# Altium schematic symbol library LATTICEPLDS_Library.SchLib: 291 symbols (part 2 of 32)
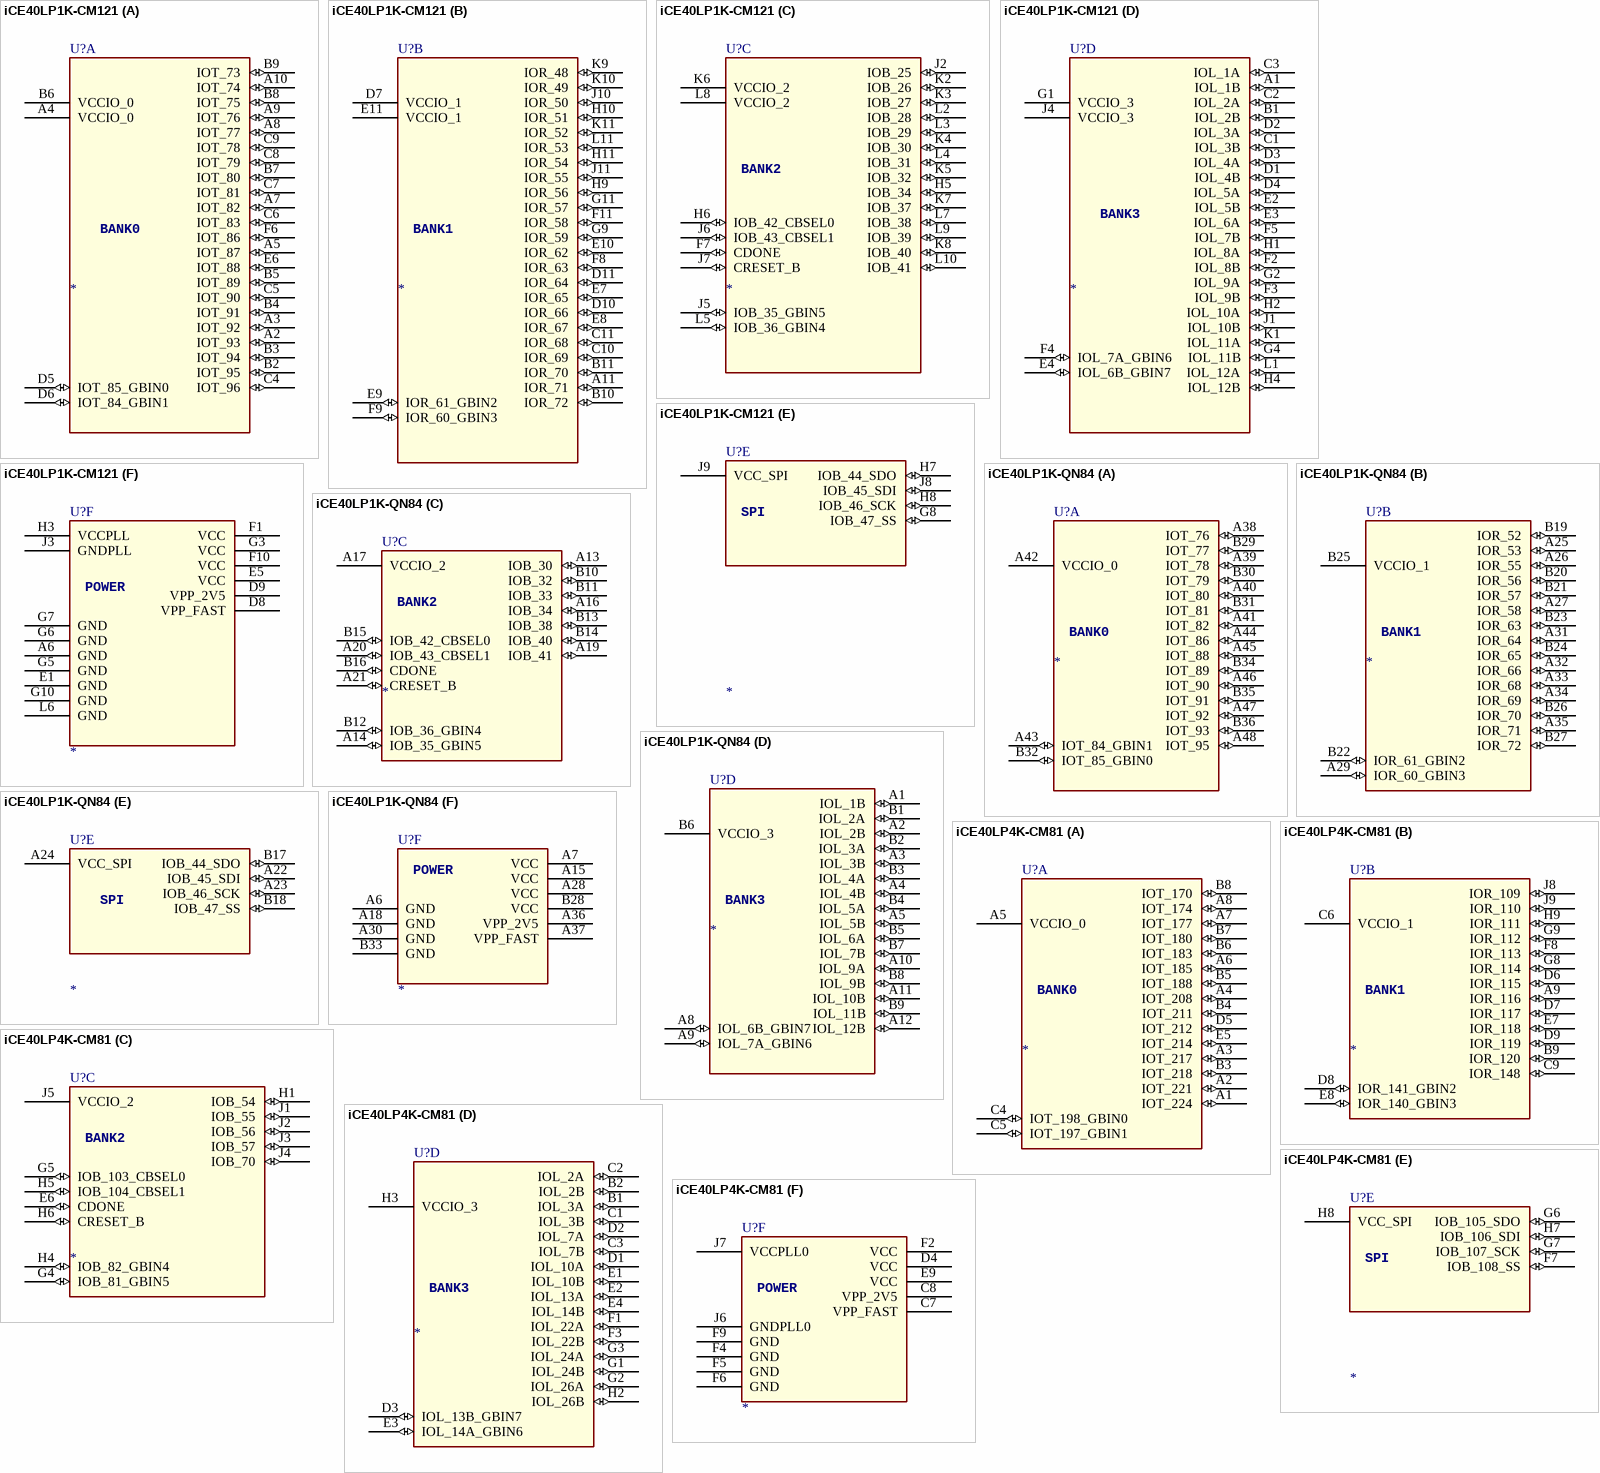
[diagram p304: symbols iCE40LP1K-CM121 to iCE40LP4K-CM81]

## iCE40LP1K-CM121
designator U?
SPLIT_INST: TRUE; SWAP_INFO: (S1+S2+S3+S4+S5+S6)
part A pins: A2 IOT_93 (io), A3 IOT_92 (io), A4 VCCIO_0 (power), A5 IOT_87 (io), A7 IOT_82 (io), A8 IOT_77 (io), A9 IOT_76 (io), A10 IOT_74 (io), B2 IOT_95 (io), B3 IOT_94 (io), B4 IOT_91 (io), B5 IOT_89 (io), B6 VCCIO_0 (power), B7 IOT_80 (io), B8 IOT_75 (io), B9 IOT_73 (io), C4 IOT_96 (io), C5 IOT_90 (io), C6 IOT_83 (io), C7 IOT_81 (io), C8 IOT_79 (io), C9 IOT_78 (io), D5 IOT_85_GBIN0 (io), D6 IOT_84_GBIN1 (io), E6 IOT_88 (io), F6 IOT_86 (io)
part B pins: A11 IOR_71 (io), B10 IOR_72 (io), B11 IOR_70 (io), C10 IOR_69 (io), C11 IOR_68 (io), D7 VCCIO_1 (power), D10 IOR_66 (io), D11 IOR_64 (io), E7 IOR_65 (io), E8 IOR_67 (io), E9 IOR_61_GBIN2 (io), E10 IOR_62 (io), E11 VCCIO_1 (power), F8 IOR_63 (io), F9 IOR_60_GBIN3 (io), F11 IOR_58 (io), G9 IOR_59 (io), G11 IOR_57 (io), H9 IOR_56 (io), H10 IOR_51 (io), H11 IOR_54 (io), J10 IOR_50 (io), J11 IOR_55 (io), K9 IOR_48 (io), K10 IOR_49 (io), K11 IOR_52 (io), L11 IOR_53 (io)
part C pins: F7 CDONE (io), H5 IOB_34 (io), H6 IOB_42_CBSEL0 (io), J2 IOB_25 (io), J5 IOB_35_GBIN5 (io), J6 IOB_43_CBSEL1 (io), J7 CRESET_B (io), K2 IOB_26 (io), K3 IOB_27 (io), K4 IOB_30 (io), K5 IOB_32 (io), K6 VCCIO_2 (power), K7 IOB_37 (io), K8 IOB_40 (io), L2 IOB_28 (io), L3 IOB_29 (io), L4 IOB_31 (io), L5 IOB_36_GBIN4 (io), L7 IOB_38 (io), L8 VCCIO_2 (power), L9 IOB_39 (io), L10 IOB_41 (io)
part D pins: A1 IOL_1B (io), B1 IOL_2B (io), C1 IOL_3B (io), C2 IOL_2A (io), C3 IOL_1A (io), D1 IOL_4B (io), D2 IOL_3A (io), D3 IOL_4A (io), D4 IOL_5A (io), E2 IOL_5B (io), E3 IOL_6A (io), E4 IOL_6B_GBIN7 (io), F2 IOL_8B (io), F3 IOL_9B (io), F4 IOL_7A_GBIN6 (io), F5 IOL_7B (io), G1 VCCIO_3 (power), G2 IOL_9A (io), G4 IOL_11B (io), H1 IOL_8A (io), H2 IOL_10A (io), H4 IOL_12B (io), J1 IOL_10B (io), J4 VCCIO_3 (power), K1 IOL_11A (io), L1 IOL_12A (io)
part E pins: G8 IOB_47_SS (io), H7 IOB_44_SDO (io), H8 IOB_46_SCK (io), J8 IOB_45_SDI (io), J9 VCC_SPI (power)
part F pins: A6 GND (power), D8 VPP_FAST (power), D9 VPP_2V5 (power), E1 GND (power), E5 VCC (power), F1 VCC (power), F10 VCC (power), G3 VCC (power), G5 GND (power), G6 GND (power), G7 GND (power), G10 GND (power), H3 VCCPLL (power), J3 GNDPLL (power), L6 GND (power)
part A text: BANK0
part B text: BANK1
part C text: BANK2
part D text: BANK3
part E text: SPI
part F text: POWER

## iCE40LP1K-QN84
designator U?
SPLIT_INST: TRUE; SWAP_INFO: (S1+S2+S3+S4+S5+S6)
part A pins: A38 IOT_76 (io), A39 IOT_78 (io), A40 IOT_80 (io), A41 IOT_82 (io), A42 VCCIO_0 (power), A43 IOT_84_GBIN1 (io), A44 IOT_86 (io), A45 IOT_88 (io), A46 IOT_90 (io), A47 IOT_92 (io), A48 IOT_95 (io), B29 IOT_77 (io), B30 IOT_79 (io), B31 IOT_81 (io), B32 IOT_85_GBIN0 (io), B34 IOT_89 (io), B35 IOT_91 (io), B36 IOT_93 (io)
part B pins: A25 IOR_53 (io), A26 IOR_55 (io), A27 IOR_58 (io), A29 IOR_60_GBIN3 (io), A31 IOR_64 (io), A32 IOR_66 (io), A33 IOR_68 (io), A34 IOR_69 (io), A35 IOR_71 (io), B19 IOR_52 (io), B20 IOR_56 (io), B21 IOR_57 (io), B22 IOR_61_GBIN2 (io), B23 IOR_63 (io), B24 IOR_65 (io), B25 VCCIO_1 (power), B26 IOR_70 (io), B27 IOR_72 (io)
part C pins: A13 IOB_30 (io), A14 IOB_35_GBIN5 (io), A16 IOB_34 (io), A17 VCCIO_2 (power), A19 IOB_41 (io), A20 IOB_43_CBSEL1 (io), A21 CRESET_B (io), B10 IOB_32 (io), B11 IOB_33 (io), B12 IOB_36_GBIN4 (io), B13 IOB_38 (io), B14 IOB_40 (io), B15 IOB_42_CBSEL0 (io), B16 CDONE (io)
part D pins: A1 IOL_1B (io), A2 IOL_2B (io), A3 IOL_3B (io), A4 IOL_4B (io), A5 IOL_5B (io), A8 IOL_6B_GBIN7 (io), A9 IOL_7A_GBIN6 (io), A10 IOL_9A (io), A11 IOL_10B (io), A12 IOL_12B (io), B1 IOL_2A (io), B2 IOL_3A (io), B3 IOL_4A (io), B4 IOL_5A (io), B5 IOL_6A (io), B6 VCCIO_3 (power), B7 IOL_7B (io), B8 IOL_9B (io), B9 IOL_11B (io)
part E pins: A22 IOB_45_SDI (io), A23 IOB_46_SCK (io), A24 VCC_SPI (power), B17 IOB_44_SDO (io), B18 IOB_47_SS (io)
part F pins: A6 GND (power), A7 VCC (power), A15 VCC (power), A18 GND (power), A28 VCC (power), A30 GND (power), A36 VPP_2V5 (power), A37 VPP_FAST (power), B28 VCC (power), B33 GND (power)
part A text: BANK0
part B text: BANK1
part C text: BANK2
part D text: BANK3
part E text: SPI
part F text: POWER

## iCE40LP4K-CM81
designator U?
SWAP_INFO: (S1+S2+S3+S4+S5+S6); SPLIT_INST: TRUE
part A pins: A1 IOT_224 (io), A2 IOT_221 (io), A3 IOT_217 (io), A4 IOT_208 (io), A5 VCCIO_0 (power), A6 IOT_185 (io), A7 IOT_177 (io), A8 IOT_174 (io), B3 IOT_218 (io), B4 IOT_211 (io), B5 IOT_188 (io), B6 IOT_183 (io), B7 IOT_180 (io), B8 IOT_170 (io), C4 IOT_198_GBIN0 (io), C5 IOT_197_GBIN1 (io), D5 IOT_212 (io), E5 IOT_214 (io)
part B pins: A9 IOR_116 (io), B9 IOR_120 (io), C6 VCCIO_1 (power), C9 IOR_148 (io), D6 IOR_115 (io), D7 IOR_117 (io), D8 IOR_141_GBIN2 (io), D9 IOR_119 (io), E7 IOR_118 (io), E8 IOR_140_GBIN3 (io), F8 IOR_113 (io), G8 IOR_114 (io), G9 IOR_112 (io), H9 IOR_111 (io), J8 IOR_109 (io), J9 IOR_110 (io)
part C pins: E6 CDONE (io), G4 IOB_81_GBIN5 (io), G5 IOB_103_CBSEL0 (io), H1 IOB_54 (io), H4 IOB_82_GBIN4 (io), H5 IOB_104_CBSEL1 (io), H6 CRESET_B (io), J1 IOB_55 (io), J2 IOB_56 (io), J3 IOB_57 (io), J4 IOB_70 (io), J5 VCCIO_2 (power)
part D pins: B1 IOL_3A (io), B2 IOL_2B (io), C1 IOL_3B (io), C2 IOL_2A (io), C3 IOL_7B (io), D1 IOL_10A (io), D2 IOL_7A (io), D3 IOL_13B_GBIN7 (io), E1 IOL_10B (io), E2 IOL_13A (io), E3 IOL_14A_GBIN6 (io), E4 IOL_14B (io), F1 IOL_22A (io), F3 IOL_22B (io), G1 IOL_24B (io), G2 IOL_26A (io), G3 IOL_24A (io), H2 IOL_26B (io), H3 VCCIO_3 (power)
part E pins: F7 IOB_108_SS (io), G6 IOB_105_SDO (io), G7 IOB_107_SCK (io), H7 IOB_106_SDI (io), H8 VCC_SPI (power)
part F pins: C7 VPP_FAST (power), C8 VPP_2V5 (power), D4 VCC (power), E9 VCC (power), F2 VCC (power), F4 GND (power), F5 GND (power), F6 GND (power), F9 GND (power), J6 GNDPLL0 (power), J7 VCCPLL0 (power)
part A text: BANK0
part B text: BANK1
part C text: BANK2
part D text: BANK3
part E text: SPI
part F text: POWER

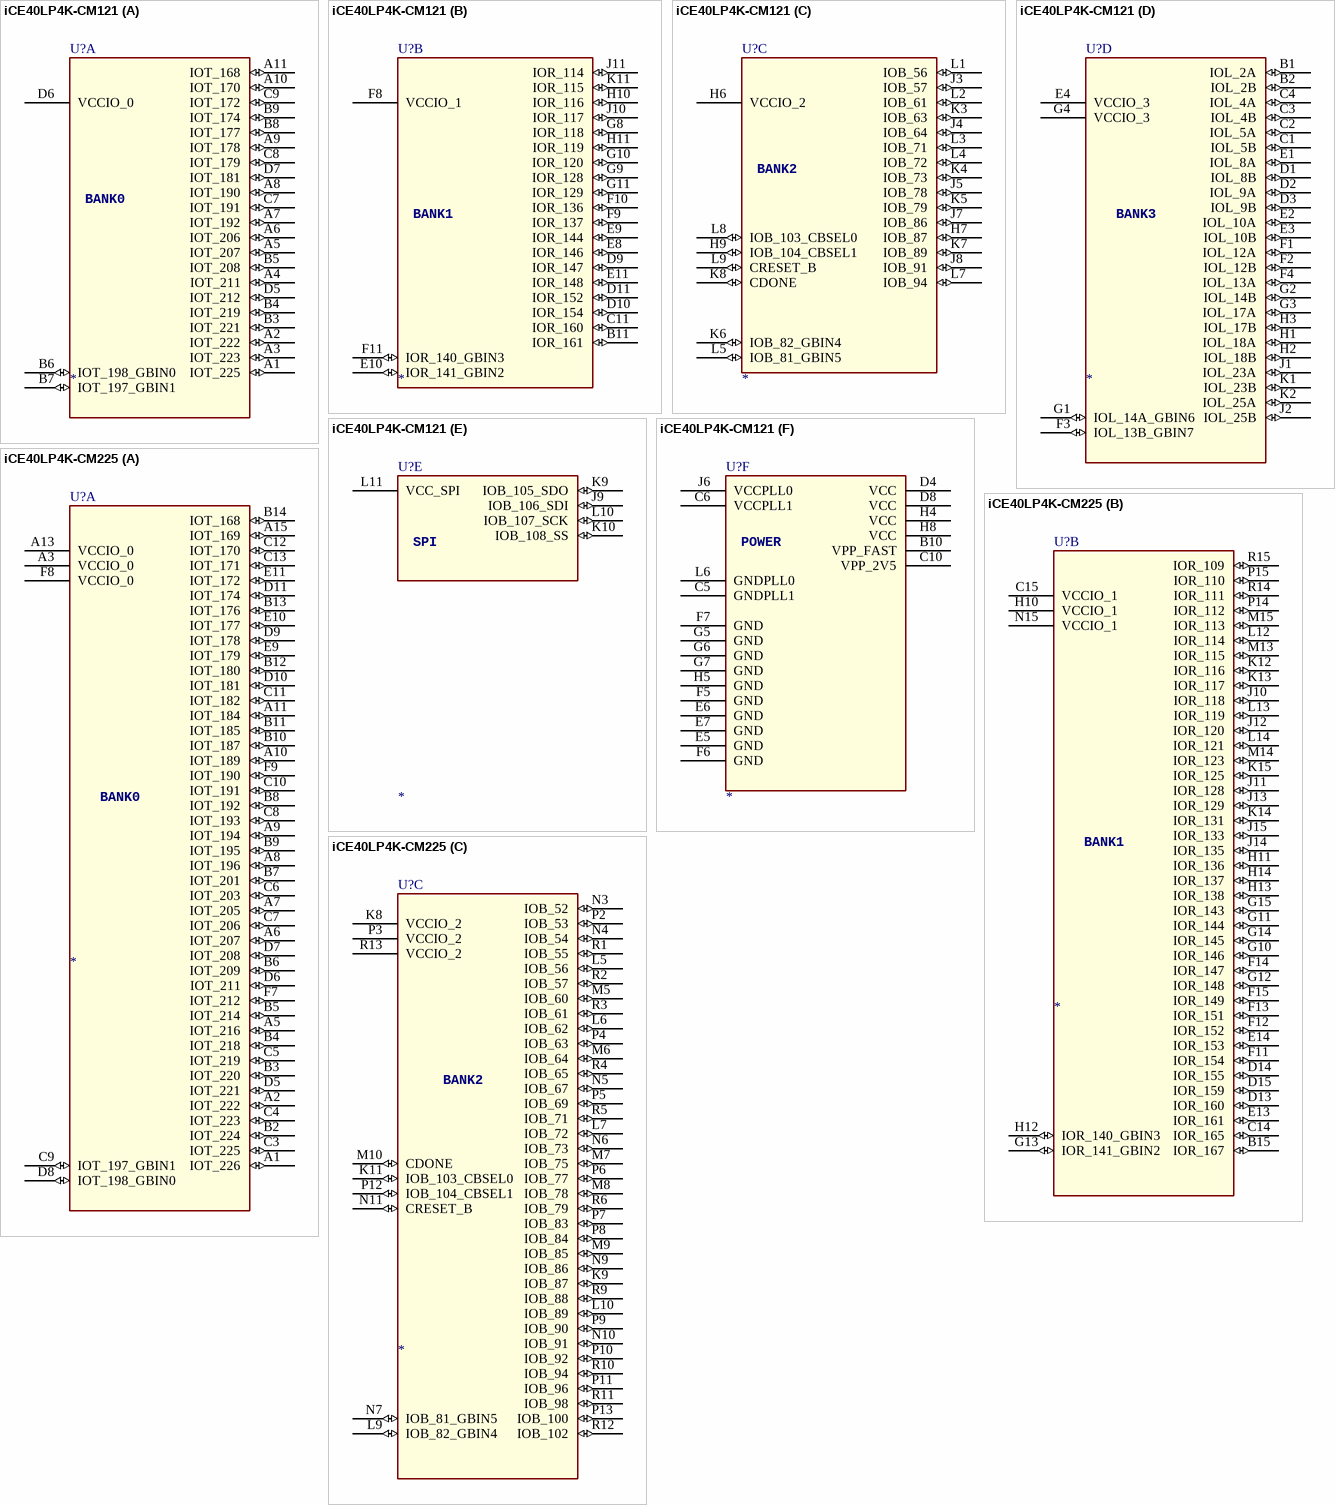
[diagram p11: symbols iCE40LP4K-CM121 to iCE40LP4K-CM225]

## iCE40LP4K-CM121
designator U?
SPLIT_INST: TRUE; SWAP_INFO: (S1+S2+S3+S4+S5+S6)
part A pins: A1 IOT_225 (io), A2 IOT_222 (io), A3 IOT_223 (io), A4 IOT_211 (io), A5 IOT_207 (io), A6 IOT_206 (io), A7 IOT_192 (io), A8 IOT_190 (io), A9 IOT_178 (io), A10 IOT_170 (io), A11 IOT_168 (io), B3 IOT_221 (io), B4 IOT_219 (io), B5 IOT_208 (io), B6 IOT_198_GBIN0 (io), B7 IOT_197_GBIN1 (io), B8 IOT_177 (io), B9 IOT_174 (io), C7 IOT_191 (io), C8 IOT_179 (io), C9 IOT_172 (io), D5 IOT_212 (io), D6 VCCIO_0 (power), D7 IOT_181 (io)
part B pins: B11 IOR_161 (io), C11 IOR_160 (io), D9 IOR_147 (io), D10 IOR_154 (io), D11 IOR_152 (io), E8 IOR_146 (io), E9 IOR_144 (io), E10 IOR_141_GBIN2 (io), E11 IOR_148 (io), F8 VCCIO_1 (power), F9 IOR_137 (io), F10 IOR_136 (io), F11 IOR_140_GBIN3 (io), G8 IOR_118 (io), G9 IOR_128 (io), G10 IOR_120 (io), G11 IOR_129 (io), H10 IOR_116 (io), H11 IOR_119 (io), J10 IOR_117 (io), J11 IOR_114 (io), K11 IOR_115 (io)
part C pins: H6 VCCIO_2 (power), H7 IOB_87 (io), H9 IOB_104_CBSEL1 (io), J3 IOB_57 (io), J4 IOB_64 (io), J5 IOB_78 (io), J7 IOB_86 (io), J8 IOB_91 (io), K3 IOB_63 (io), K4 IOB_73 (io), K5 IOB_79 (io), K6 IOB_82_GBIN4 (io), K7 IOB_89 (io), K8 CDONE (io), L1 IOB_56 (io), L2 IOB_61 (io), L3 IOB_71 (io), L4 IOB_72 (io), L5 IOB_81_GBIN5 (io), L7 IOB_94 (io), L8 IOB_103_CBSEL0 (io), L9 CRESET_B (io)
part D pins: B1 IOL_2A (io), B2 IOL_2B (io), C1 IOL_5B (io), C2 IOL_5A (io), C3 IOL_4B (io), C4 IOL_4A (io), D1 IOL_8B (io), D2 IOL_9A (io), D3 IOL_9B (io), E1 IOL_8A (io), E2 IOL_10A (io), E3 IOL_10B (io), E4 VCCIO_3 (power), F1 IOL_12A (io), F2 IOL_12B (io), F3 IOL_13B_GBIN7 (io), F4 IOL_13A (io), G1 IOL_14A_GBIN6 (io), G2 IOL_14B (io), G3 IOL_17A (io), G4 VCCIO_3 (power), H1 IOL_18A (io), H2 IOL_18B (io), H3 IOL_17B (io), J1 IOL_23A (io), J2 IOL_25B (io), K1 IOL_23B (io), K2 IOL_25A (io)
part E pins: J9 IOB_106_SDI (io), K9 IOB_105_SDO (io), K10 IOB_108_SS (io), L10 IOB_107_SCK (io), L11 VCC_SPI (power)
part F pins: B10 VPP_FAST (power), C5 GNDPLL1 (power), C6 VCCPLL1 (power), C10 VPP_2V5 (power), D4 VCC (power), D8 VCC (power), E5 GND (power), E6 GND (power), E7 GND (power), F5 GND (power), F6 GND (power), F7 GND (power), G5 GND (power), G6 GND (power), G7 GND (power), H4 VCC (power), H5 GND (power), H8 VCC (power), J6 VCCPLL0 (power), L6 GNDPLL0 (power)
part A text: BANK0
part B text: BANK1
part C text: BANK2
part D text: BANK3
part E text: SPI
part F text: POWER

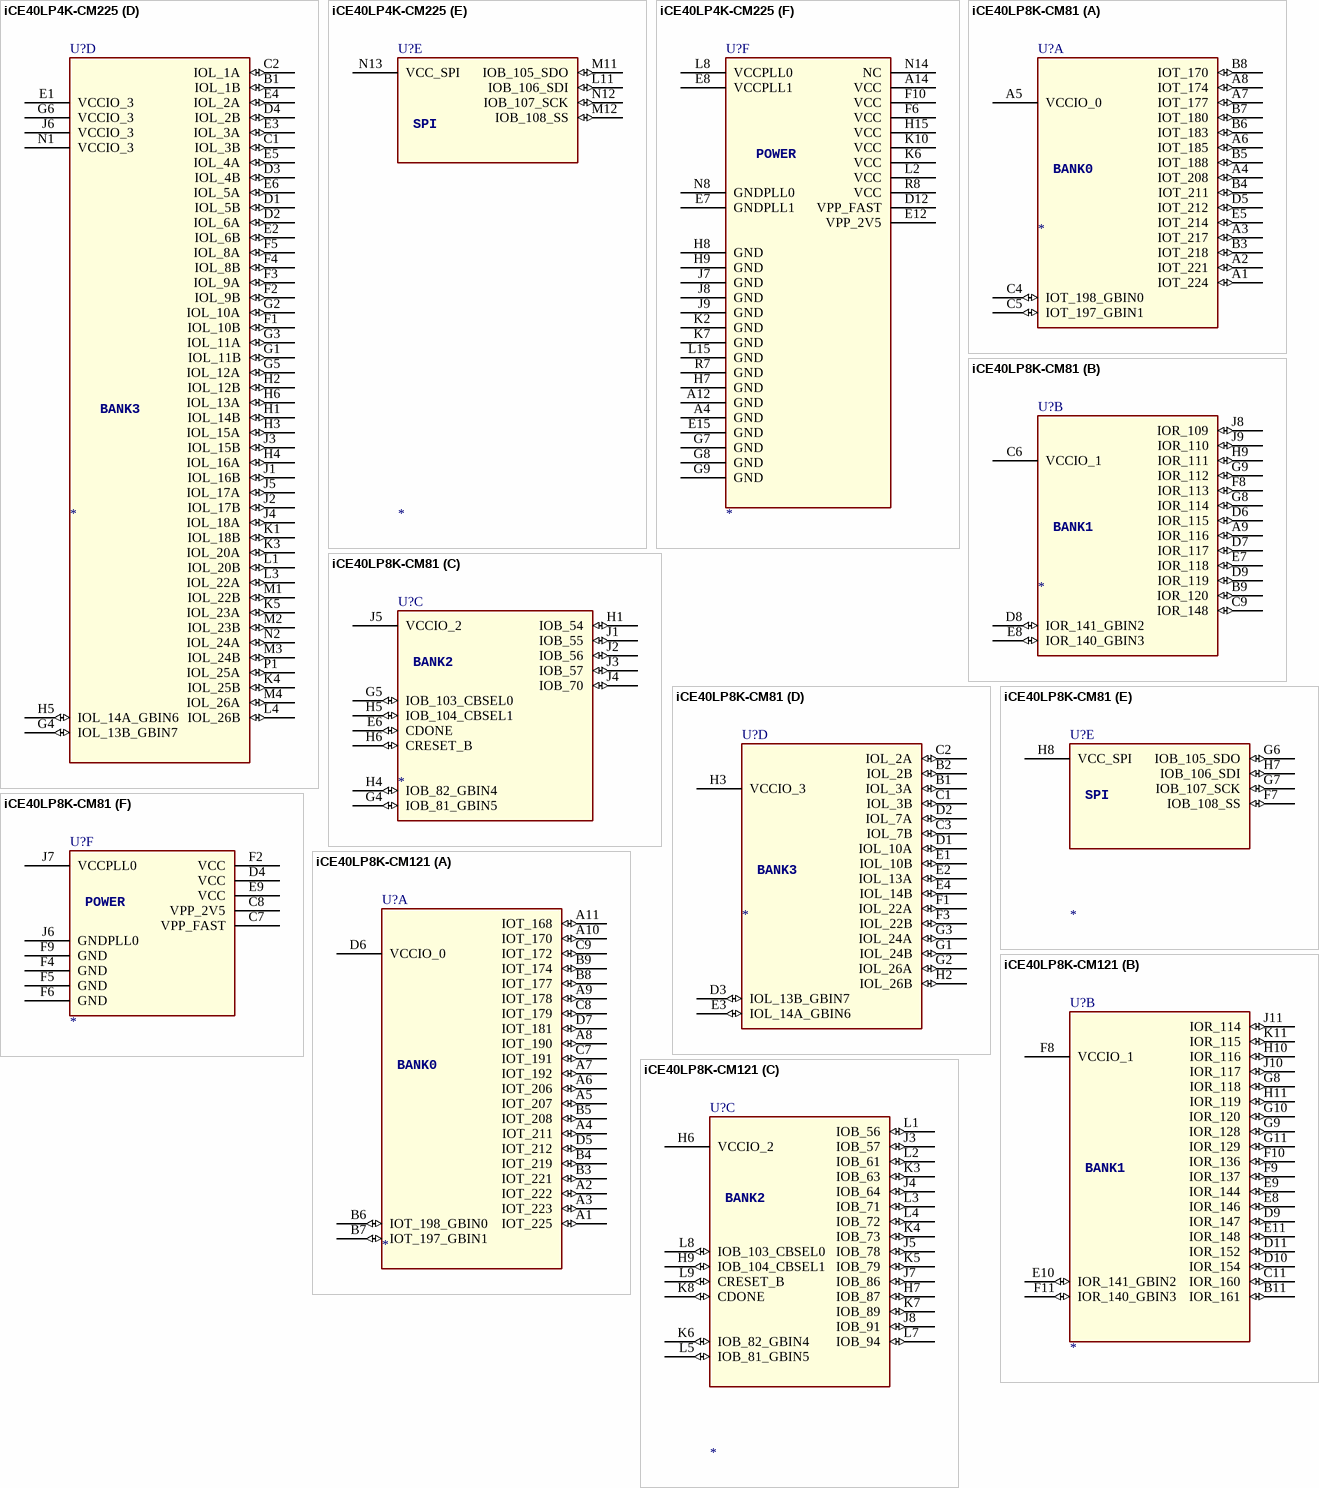
[diagram p12: symbols iCE40LP4K-CM225 to iCE40LP8K-CM121]

## iCE40LP4K-CM225
designator U?
SPLIT_INST: TRUE; SWAP_INFO: (S1+S2+S3+S4+S5+S6)
part A pins: A1 IOT_226 (io), A2 IOT_222 (io), A3 VCCIO_0 (power), A5 IOT_216 (io), A6 IOT_207 (io), A7 IOT_205 (io), A8 IOT_196 (io), A9 IOT_194 (io), A10 IOT_189 (io), A11 IOT_184 (io), A13 VCCIO_0 (power), A15 IOT_169 (io), B2 IOT_224 (io), B3 IOT_220 (io), B4 IOT_218 (io), B5 IOT_214 (io), B6 IOT_209 (io), B7 IOT_201 (io), B8 IOT_192 (io), B9 IOT_195 (io), B10 IOT_187 (io), B11 IOT_185 (io), B12 IOT_180 (io), B13 IOT_176 (io), B14 IOT_168 (io), C3 IOT_225 (io), C4 IOT_223 (io), C5 IOT_219 (io), C6 IOT_203 (io), C7 IOT_206 (io), C8 IOT_193 (io), C9 IOT_197_GBIN1 (io), C10 IOT_191 (io), C11 IOT_182 (io), C12 IOT_170 (io), C13 IOT_171 (io), D5 IOT_221 (io), D6 IOT_211 (io), D7 IOT_208 (io), D8 IOT_198_GBIN0 (io), D9 IOT_178 (io), D10 IOT_181 (io), D11 IOT_174 (io), E9 IOT_179 (io), E10 IOT_177 (io), E11 IOT_172 (io), F7 IOT_212 (io), F8 VCCIO_0 (power), F9 IOT_190 (io)
part B pins: B15 IOR_167 (io), C14 IOR_165 (io), C15 VCCIO_1 (power), D13 IOR_160 (io), D14 IOR_155 (io), D15 IOR_159 (io), E13 IOR_161 (io), E14 IOR_153 (io), F11 IOR_154 (io), F12 IOR_152 (io), F13 IOR_151 (io), F14 IOR_147 (io), F15 IOR_149 (io), G10 IOR_146 (io), G11 IOR_144 (io), G12 IOR_148 (io), G13 IOR_141_GBIN2 (io), G14 IOR_145 (io), G15 IOR_143 (io), H10 VCCIO_1 (power), H11 IOR_136 (io), H12 IOR_140_GBIN3 (io), H13 IOR_138 (io), H14 IOR_137 (io), J10 IOR_118 (io), J11 IOR_128 (io), J12 IOR_120 (io), J13 IOR_129 (io), J14 IOR_135 (io), J15 IOR_133 (io), K12 IOR_116 (io), K13 IOR_117 (io), K14 IOR_131 (io), K15 IOR_125 (io), L12 IOR_114 (io), L13 IOR_119 (io), L14 IOR_121 (io), M13 IOR_115 (io), M14 IOR_123 (io), M15 IOR_113 (io), N15 VCCIO_1 (power), P14 IOR_112 (io), P15 IOR_110 (io), R14 IOR_111 (io), R15 IOR_109 (io)
part C pins: K8 VCCIO_2 (power), K9 IOB_87 (io), K11 IOB_103_CBSEL0 (io), L5 IOB_56 (io), L6 IOB_62 (io), L7 IOB_72 (io), L9 IOB_82_GBIN4 (io), L10 IOB_89 (io), M5 IOB_60 (io), M6 IOB_64 (io), M7 IOB_75 (io), M8 IOB_78 (io), M9 IOB_85 (io), M10 CDONE (io), N3 IOB_52 (io), N4 IOB_54 (io), N5 IOB_67 (io), N6 IOB_73 (io), N7 IOB_81_GBIN5 (io), N9 IOB_86 (io), N10 IOB_91 (io), N11 CRESET_B (io), P2 IOB_53 (io), P3 VCCIO_2 (power), P4 IOB_63 (io), P5 IOB_69 (io), P6 IOB_77 (io), P7 IOB_83 (io), P8 IOB_84 (io), P9 IOB_90 (io), P10 IOB_92 (io), P11 IOB_96 (io), P12 IOB_104_CBSEL1 (io), P13 IOB_100 (io), R1 IOB_55 (io), R2 IOB_57 (io), R3 IOB_61 (io), R4 IOB_65 (io), R5 IOB_71 (io), R6 IOB_79 (io), R9 IOB_88 (io), R10 IOB_94 (io), R11 IOB_98 (io), R12 IOB_102 (io), R13 VCCIO_2 (power)
part D pins: B1 IOL_1B (io), C1 IOL_3B (io), C2 IOL_1A (io), D1 IOL_5B (io), D2 IOL_6A (io), D3 IOL_4B (io), D4 IOL_2B (io), E1 VCCIO_3 (power), E2 IOL_6B (io), E3 IOL_3A (io), E4 IOL_2A (io), E5 IOL_4A (io), E6 IOL_5A (io), F1 IOL_10B (io), F2 IOL_9B (io), F3 IOL_9A (io), F4 IOL_8B (io), F5 IOL_8A (io), G1 IOL_11B (io), G2 IOL_10A (io), G3 IOL_11A (io), G4 IOL_13B_GBIN7 (io), G5 IOL_12A (io), G6 VCCIO_3 (power), H1 IOL_14B (io), H2 IOL_12B (io), H3 IOL_15A (io), H4 IOL_16A (io), H5 IOL_14A_GBIN6 (io), H6 IOL_13A (io), J1 IOL_16B (io), J2 IOL_17B (io), J3 IOL_15B (io), J4 IOL_18A (io), J5 IOL_17A (io), J6 VCCIO_3 (power), K1 IOL_18B (io), K3 IOL_20A (io), K4 IOL_25B (io), K5 IOL_23A (io), L1 IOL_20B (io), L3 IOL_22A (io), L4 IOL_26B (io), M1 IOL_22B (io), M2 IOL_23B (io), M3 IOL_24B (io), M4 IOL_26A (io), N1 VCCIO_3 (power), N2 IOL_24A (io), P1 IOL_25A (io)
part E pins: L11 IOB_106_SDI (io), M11 IOB_105_SDO (io), M12 IOB_108_SS (io), N12 IOB_107_SCK (io), N13 VCC_SPI (power)
part F pins: A4 GND (power), A12 GND (power), A14 VCC (power), D12 VPP_FAST (power), E7 GNDPLL1 (power), E8 VCCPLL1 (power), E12 VPP_2V5 (power), E15 GND (power), F6 VCC (power), F10 VCC (power), G7 GND (power), G8 GND (power), G9 GND (power), H7 GND (power), H8 GND (power), H9 GND (power), H15 VCC (power), J7 GND (power), J8 GND (power), J9 GND (power), K2 GND (power), K6 VCC (power), K7 GND (power), K10 VCC (power), L2 VCC (power), L8 VCCPLL0 (power), L15 GND (power), N8 GNDPLL0 (power), N14 NC (power), R7 GND (power), R8 VCC (power)
part A text: BANK0
part B text: BANK1
part C text: BANK2
part D text: BANK3
part E text: SPI
part F text: POWER

## iCE40LP8K-CM81
designator U?
SPLIT_INST: TRUE; SWAP_INFO: (S1+S2+S3+S4+S5+S6)
part A pins: A1 IOT_224 (io), A2 IOT_221 (io), A3 IOT_217 (io), A4 IOT_208 (io), A5 VCCIO_0 (power), A6 IOT_185 (io), A7 IOT_177 (io), A8 IOT_174 (io), B3 IOT_218 (io), B4 IOT_211 (io), B5 IOT_188 (io), B6 IOT_183 (io), B7 IOT_180 (io), B8 IOT_170 (io), C4 IOT_198_GBIN0 (io), C5 IOT_197_GBIN1 (io), D5 IOT_212 (io), E5 IOT_214 (io)
part B pins: A9 IOR_116 (io), B9 IOR_120 (io), C6 VCCIO_1 (power), C9 IOR_148 (io), D6 IOR_115 (io), D7 IOR_117 (io), D8 IOR_141_GBIN2 (io), D9 IOR_119 (io), E7 IOR_118 (io), E8 IOR_140_GBIN3 (io), F8 IOR_113 (io), G8 IOR_114 (io), G9 IOR_112 (io), H9 IOR_111 (io), J8 IOR_109 (io), J9 IOR_110 (io)
part C pins: E6 CDONE (io), G4 IOB_81_GBIN5 (io), G5 IOB_103_CBSEL0 (io), H1 IOB_54 (io), H4 IOB_82_GBIN4 (io), H5 IOB_104_CBSEL1 (io), H6 CRESET_B (io), J1 IOB_55 (io), J2 IOB_56 (io), J3 IOB_57 (io), J4 IOB_70 (io), J5 VCCIO_2 (power)
part D pins: B1 IOL_3A (io), B2 IOL_2B (io), C1 IOL_3B (io), C2 IOL_2A (io), C3 IOL_7B (io), D1 IOL_10A (io), D2 IOL_7A (io), D3 IOL_13B_GBIN7 (io), E1 IOL_10B (io), E2 IOL_13A (io), E3 IOL_14A_GBIN6 (io), E4 IOL_14B (io), F1 IOL_22A (io), F3 IOL_22B (io), G1 IOL_24B (io), G2 IOL_26A (io), G3 IOL_24A (io), H2 IOL_26B (io), H3 VCCIO_3 (power)
part E pins: F7 IOB_108_SS (io), G6 IOB_105_SDO (io), G7 IOB_107_SCK (io), H7 IOB_106_SDI (io), H8 VCC_SPI (power)
part F pins: C7 VPP_FAST (power), C8 VPP_2V5 (power), D4 VCC (power), E9 VCC (power), F2 VCC (power), F4 GND (power), F5 GND (power), F6 GND (power), F9 GND (power), J6 GNDPLL0 (power), J7 VCCPLL0 (power)
part A text: BANK0
part B text: BANK1
part C text: BANK2
part D text: BANK3
part E text: SPI
part F text: POWER

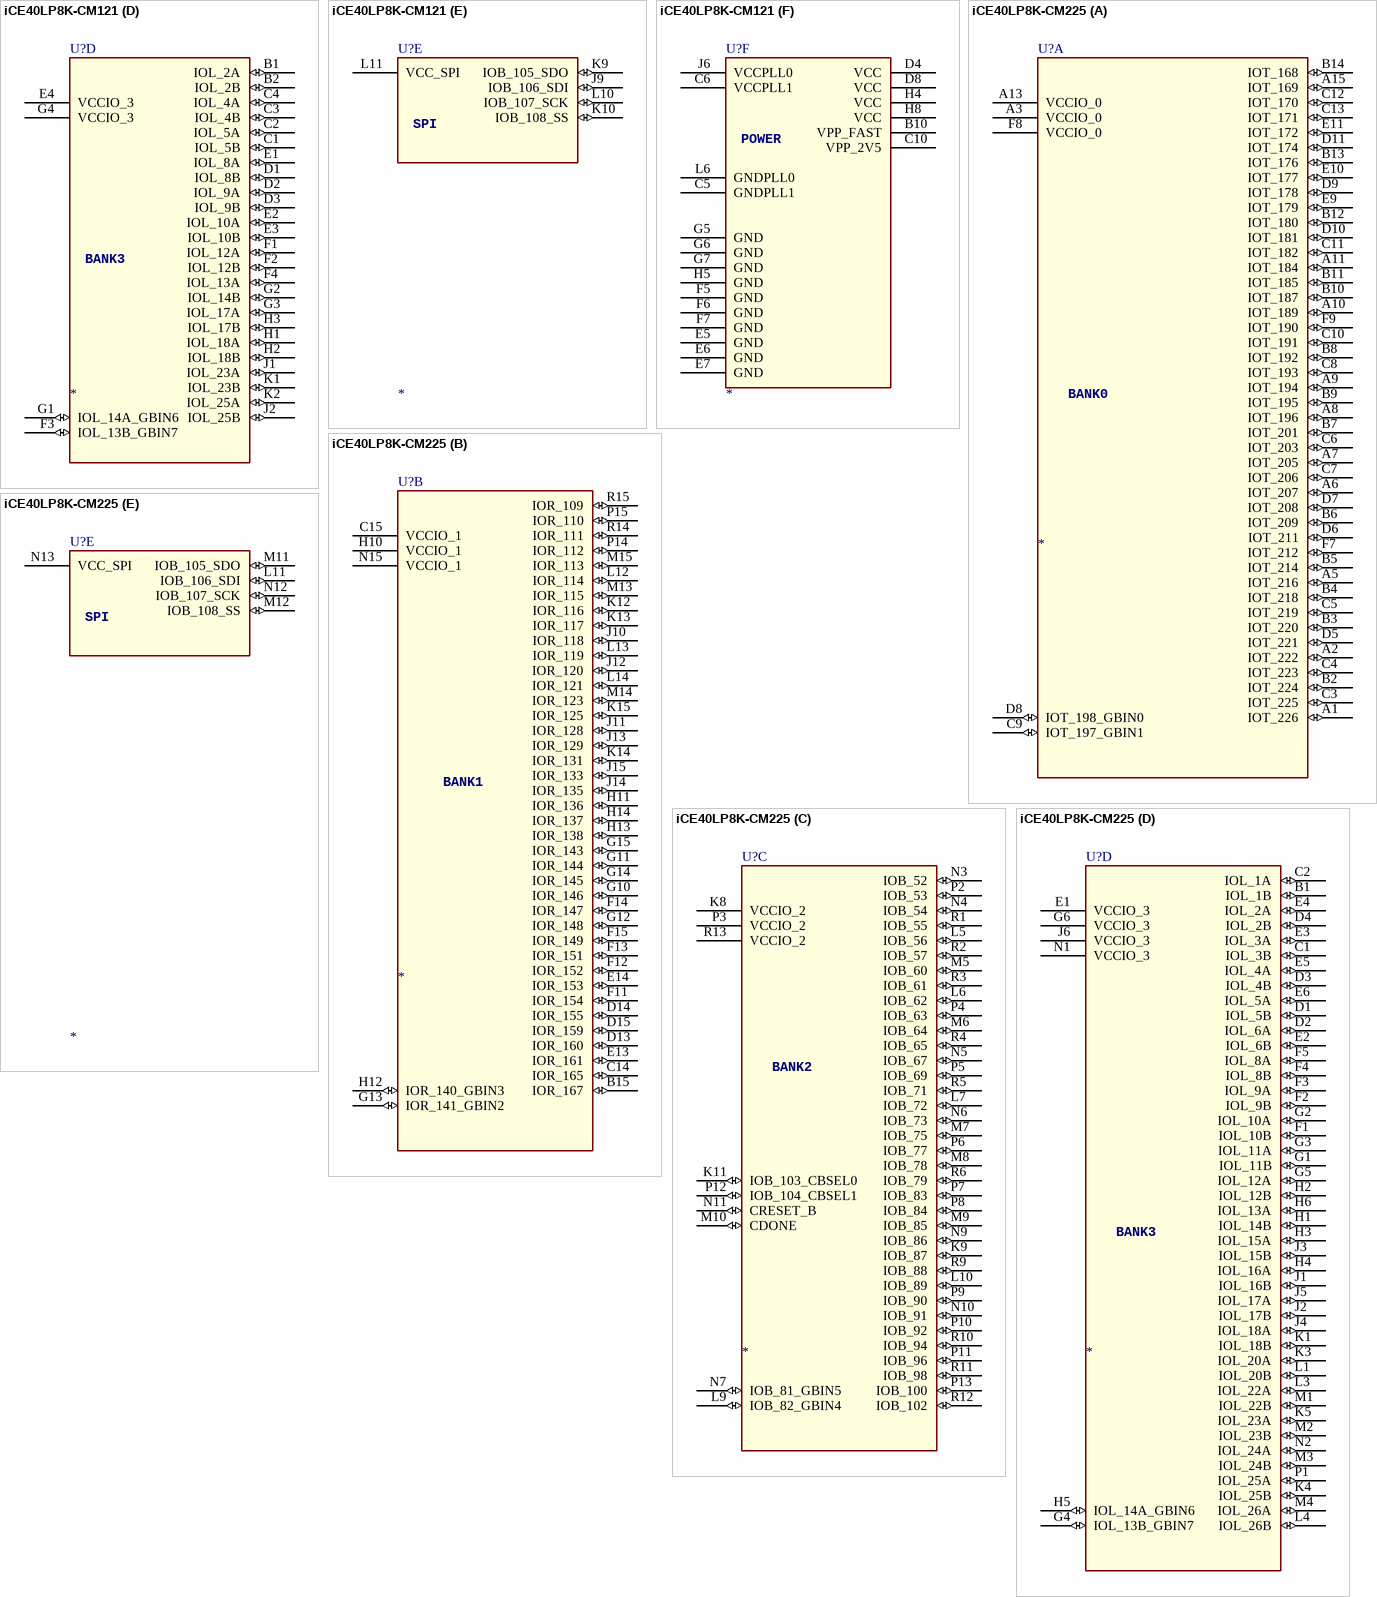
[diagram p13: symbols iCE40LP8K-CM121 to iCE40LP8K-CM225]
